# Altium footprint library 1.30-二极管-整流桥堆.PcbLib: 52 footprints (part 3 of 4)
Each footprint in its own frame and in the unit in brackets; x right, y up, seen from the top. Pads: shape width x height; smd on the part's side, far side on the other; paste and mask are expansions set on the pad; w line width, h text height; cw(c..) or ccw(c..) is an arc to the next point about the centre after c.
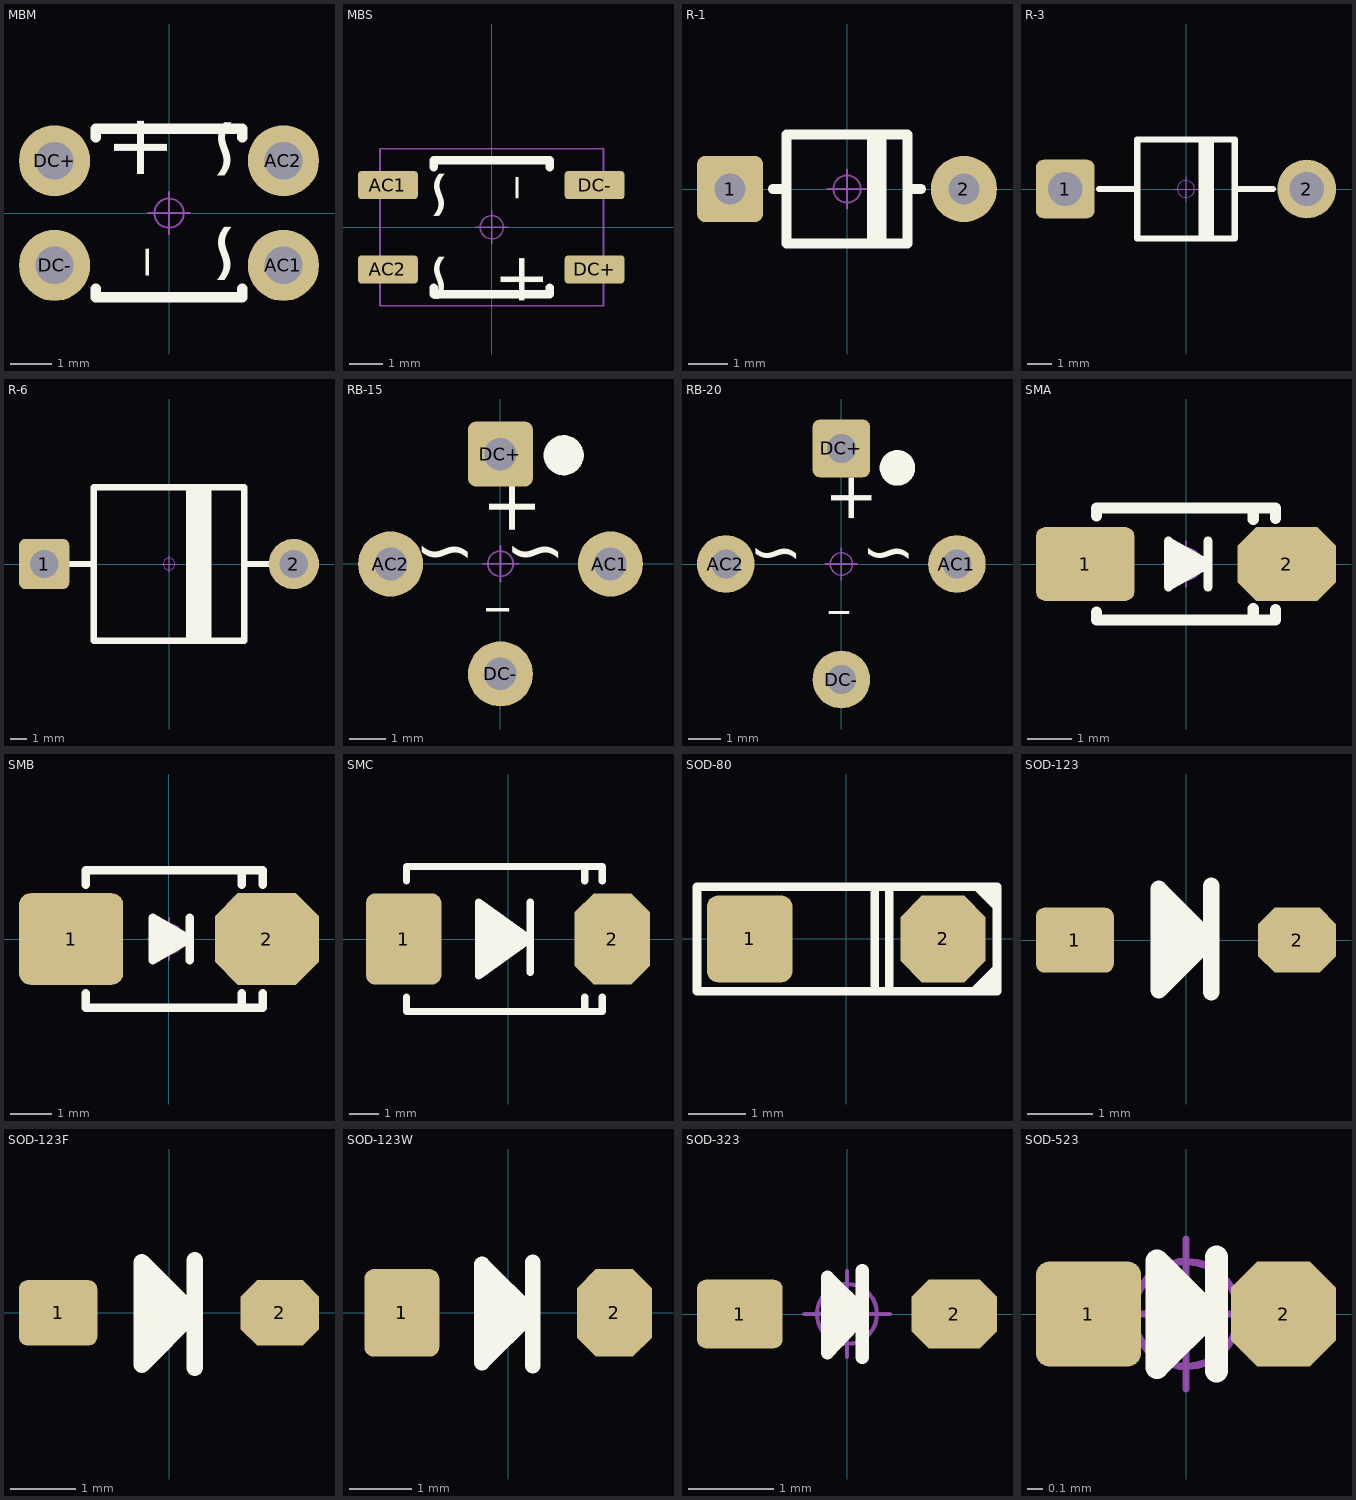
[diagram p2: the footprints below, top view; thin cyan lines are the x and y axes]

## MBM [mm] "4.8*5.2*2.5mm(长宽高)"
pads (4):
  round 1.7 hole 0.9: AC1(2.737,-1.25) AC2(2.737,1.25) DC+(-2.737,1.25) DC-(-2.737,-1.25)
Top Overlay:
  lines w0.254: -1.75,-1.811 -1.75,-2.015 1.75,-2.015 1.75,-1.811 ; -1.75,1.811 -1.75,2.015 1.75,2.015 1.75,1.811
  text "~" at 0.199,-1.817 h2.54
  text "~" at 0.199,0.683 h2.54
  text "-" at -1.707,-1.621 h3.05
  text "+" at -1.8,0.714 h2.54
Mechanical 15:
  circle w0.05: c0,0 r0.35
  lines w0.05: -0.5,0 0.5,0 ; 0,-0.5 0,0.5
3D body "MBM.STEP": height 2.6, standoff -3.11, extent -3.124,-2.4 3.124,2.4

## MBS [mm] "4.1*6.8*2.5mm(长宽高)"
height 12.3
pads (4):
  rrect25% 1.8x0.85 smd: AC1(-3.127,1.27) AC2(-3.127,-1.27) DC+(3.096,-1.27) DC-(3.096,1.27)
Top Overlay:
  lines w0.254: -1.75,-1.811 -1.75,-2.015 1.75,-2.015 1.75,-1.811 ; -1.75,1.811 -1.75,2.015 1.75,2.015 1.75,1.811
  text "+" at 2.05,-0.714 h2.54
  text "-" at 1.957,1.621 h3.05
  text "~" at -0.449,-0.683 h2.54
  text "~" at -0.449,1.817 h2.54
Mechanical 13:
  lines w0.05: -3.363,-2.363 3.363,-2.363 3.363,2.362 -3.363,2.362 -3.363,-2.363
Mechanical 15:
  circle w0.05: c0,0 r0.35
  lines w0.05: -0.5,0 0.5,0 ; 0,-0.5 0,0.5
3D body "MBS.STEP": height 2.6, standoff -0.03, extent -3.4,-2.4 3.4,2.4

## R-1 [mm] "2.5*6mm(直径，脚距）"
pads (2):
  rrect25% 1.7x1.7 hole 0.8: 1(-3,0)
  round 1.7 hole 0.8: 2(3,0)
Top Overlay:
  rectangle: 0.508,-1.397 1.016,1.397
  lines w0.254: -1.905,0 -1.55,0 ; 1.55,0 1.905,0 ; -1.55,-1.397 1.55,-1.397 1.55,1.397 -1.55,1.397 -1.55,-1.397
Mechanical 15:
  circle w0.05: c0,0 r0.35
  lines w0.05: -0.5,0 0.5,0 ; 0,-0.5 0,0.5
3D body "R-1.STEP": height 2.55, standoff -3.45, extent -3.3,-1.251 3.3,1.251

## R-3 [mm] "3.9*9.9mm(直径，脚距）"
pads (2):
  rrect25% 2.4x2.4 hole 1.4: 1(-4.95,0)
  round 2.4 hole 1.4: 2(4.95,0)
Top Overlay:
  rectangle: 0.508,-2.032 1.143,2.032
  lines w0.254: -3.556,0 -2,0 ; 2.032,0 3.556,0 ; -2,-2.032 -2,2.032 2,2.032 2,-2.032 -2,-2.032
Mechanical 15:
  circle w0.05: c0,0 r0.35
  lines w0.05: -0.5,0 0.5,0 ; 0,-0.5 0,0.5
3D body "R-3.STEP": height 3.95, standoff -3.45, extent -5.5,-1.951 5.5,1.951

## R-6 [mm] "8.8*14.9mm(直径，脚距）"
pads (2):
  rrect25% 3x3 hole 1.7: 1(-7.45,0)
  round 3 hole 1.7: 2(7.45,0)
Top Overlay:
  rectangle: 1.016,-4.572 2.54,4.572
  lines w0.381: -6.056,0 -4.5,0 ; 4.5,0 6.024,0 ; -4.5,-4.572 -4.5,4.572 4.5,4.572 4.5,-4.572 -4.5,-4.572
Mechanical 15:
  circle w0.05: c0,0 r0.35
  lines w0.05: -0.5,0 0.5,0 ; 0,-0.5 0,0.5
3D body "R-6.STEP": height 8.8, standoff -3.5, extent -8.1,-4.401 8.1,4.401

## RB-15 [mm] "8.9*3.5mm(直径，高)"
pads (4):
  round 1.8 hole 0.9: AC1(3.041,-0.007) AC2(-3.041,-0.007) DC-(0,-3.048)
  rrect25% 1.8x1.8 hole 0.9: DC+(0,3.033)
Top Overlay:
  circle w0.6: c1.75,3 r0.254
  text "-" at 0.371,-2.457 h3.05
  text "~" at 1.817,-0.801 h2.54
  text "~" at -0.683,-0.801 h2.54
  text "+" at -0.8,0.714 h2.54
Mechanical 15:
  circle w0.05: c0,0 r0.35
  lines w0.05: -0.5,0 0.5,0 ; 0,-0.5 0,0.5
3D body "RB-15.STEP": height 3.63, standoff -3.37, extent -4.45,-4.445 4.45,4.445

## RB-20 [mm] "8.9*3.5mm(直径，高)"
pads (4):
  round 1.8 hole 0.9: AC1(3.606,0) AC2(-3.606,0) DC-(0,-3.606)
  rrect25% 1.8x1.8 hole 0.9: DC+(0,3.606)
Top Overlay:
  circle w0.6: c1.75,3 r0.254
  text "-" at 0.371,-2.707 h3.05
  text "~" at 2.317,-0.801 h2.54
  text "~" at -1.183,-0.801 h2.54
  text "+" at -0.8,1.214 h2.54
Mechanical 15:
  circle w0.05: c0,0 r0.35
  lines w0.05: -0.5,0 0.5,0 ; 0,-0.5 0,0.5
3D body "RB-20.STEP": height 5.48, standoff -3.37, extent -4.625,-4.62 4.625,4.62

## SMA [mm] "4.5x2.6*2.2mm（长宽高，不包括引脚）"
height 2.54
pads (2):
  rrect25% 2.2x1.65 smd: 1(-2.25,0)
  oct 2.2x1.65 smd: 2(2.25,0)
Top Overlay:
  lines w0.203: 0.494,-0.508 0.494,0.508 ; -0.395,-0.508 -0.395,0.508 0.494,0 -0.395,-0.508
  lines w0.254: -2,-1.08 -2,-1.25 2,-1.25 2,-1.016 ; -2,1.08 -2,1.25 2,1.25 2,1.016 ; -0.33,0.305 0.305,0 -0.254,-0.305 -0.254,0.051 0.023,0 ; 1.5,-1.25 1.5,-1 ; 1.5,1 1.5,1.25
Mechanical 15:
  circle w0.05: c0,0 r0.35
  lines w0.05: -0.5,0 0.5,0 ; 0,-0.5 0,0.5
3D body "SMA.stp": height 2.15, standoff 0.05, extent -2.552,-1.3 2.552,1.3

## SMB [mm] "4.7*3.9*2.2mm(长宽高，不包括引脚）"
height 2.4
pads (2):
  rrect25% 2.5x2.2 smd: 1(-2.35,0)
  oct 2.5x2.2 smd: 2(2.35,0)
Top Overlay:
  lines w0.2: -2,-1.298 -2,-1.648 2.25,-1.648 2.25,-1.298 ; -2,1.298 -2,1.648 2.25,1.648 2.25,1.298 ; 1.75,-1.648 1.75,-1.298 ; 1.75,1.298 1.75,1.648
  lines w0.203: 0.5,-0.508 0.5,0.508 ; -0.389,-0.508 -0.389,0.508 0.5,0 -0.389,-0.508
  lines w0.254: -0.254,0 0.279,0 ; 0.279,0 -0.229,0.279 -0.229,-0.305 0.279,0
Mechanical 15:
  circle w0.05: c0,0 r0.35
  lines w0.05: -0.5,0 0.5,0 ; 0,-0.5 0,0.5
3D body "SMB.stp": height 2.35, standoff 0.05, extent -2.65,-1.8 2.65,1.8

## SMC [mm] "7.1x5.9*2.3mm（长宽高，不包括引脚）"
height 2.41
pads (2):
  rrect25% 2.6x3.15 smd: 1(-3.6,0)
  oct 2.6x3.15 smd: 2(3.6,0)
Top Overlay:
  lines w0.254: -3.5,-2 -3.5,-2.5 3.25,-2.5 3.25,-2 ; -3.5,2 -3.5,2.5 3.25,2.5 3.25,2 ; -0.889,0.991 0.5,0 -0.889,-0.965 -0.914,0.762 0.229,0 -0.711,-0.66 -0.762,0.483 0,-0.051 -0.584,-0.33 -0.635,0.152 -0.229,-0.051 -0.737,-0.127 ; 0.762,-1.143 0.762,1.27 ; 2.65,-2.4 2.65,-2 ; 2.65,2 2.65,2.4 ; -1.016,-1.27 -1.016,1.27 0.762,0 -1.016,-1.27
Mechanical 15:
  circle w0.05: c0,0 r0.35
  lines w0.05: -0.5,0 0.5,0 ; 0,-0.5 0,0.5
3D body "SMC.stp": height 2.43, standoff 0.03, extent -3.952,-2.9 3.951,2.9

## SOD-80 [mm]
pads (2):
  rrect25% 1.5x1.524 smd: 1(-1.7,0)
  oct 1.5x1.524 smd: 2(1.7,0)
Top Overlay:
  lines w0.15: -2.627,0.918 -2.627,-0.921 2.648,-0.921 2.648,0.921 -2.627,0.921 ; 0.5,-0.924 0.5,0.897 ; 0.75,-0.924 0.75,0.882 ; 2.242,-0.921 2.648,-0.515 ; 2.289,0.921 2.648,0.56 ; 2.446,0.866 2.596,0.716 ; 2.45,-0.865 2.572,-0.743
3D body "SOD-80.STEP": height 1.5, standoff 0, extent -1.672,-0.75 1.828,0.75

## SOD-123 [mm] "2.7x1.6X1.1mm（长宽高，不包括引脚） 淘宝ID:黄晶宝石"
pads (2):
  rrect25% 1.2x1 smd: 1(-1.714,0)
  oct 1.2x1 smd: 2(1.714,0)
Top Overlay:
  lines w0.254: -0.258,-0.559 -0.233,0.432 0.25,0 -0.004,-0.254 -0.004,0 -0.004,0.254 ; 0.352,0.02 -0.421,0.792 -0.421,-0.775 0.392,0.038 ; 0.392,-0.805 0.392,0.841
Mechanical 15:
  circle w0.05: c0,0 r0.35
  lines w0.05: -0.5,0 0.5,0 ; 0,-0.5 0,0.5
3D body "SOD-123.stp": height 1.2, standoff -0.02, extent -1.85,-0.8 1.85,0.8

## SOD-123F [mm] "2.7x1.6X1.1mm（长宽高，不包括引脚）"
pads (2):
  rrect25% 1.2x1 smd: 1(-1.7,0)
  oct 1.2x1 smd: 2(1.7,0)
Top Overlay:
  lines w0.254: -0.254,0.559 -0.229,-0.432 0.254,0 0,0.254 0,0 0,-0.254 ; 0.356,-0.02 -0.417,-0.792 -0.417,0.775 0.396,-0.038 ; 0.396,-0.841 0.396,0.805
Mechanical 15:
  circle w0.05: c0,0 r0.35
  lines w0.05: -0.5,0 0.5,0 ; 0,-0.5 0,0.5
3D body "SOD-123F.stp": height 1.13, standoff 0.02, extent -1.9,-0.8 1.9,0.8

## SOD-123W [mm]
pads (2):
  rrect25% 1.2x1.4 smd: 1(-1.7,0)
  oct 1.2x1.4 smd: 2(1.7,0)
Top Overlay:
  lines w0.254: -0.254,0.559 -0.229,-0.432 0.254,0 0,0.254 0,0 0,-0.254 ; 0.356,-0.02 -0.417,-0.792 -0.417,0.775 0.396,-0.038 ; 0.396,-0.841 0.396,0.805
Mechanical 15:
  lines w0.003: -0.098,0.537 -0.048,0.588
3D body "User Library-SOD123W.x_b": height 1.13, standoff 0.02, extent -2,-0.95 2,0.95

## SOD-323 [mm] "1.8x1.3X0.9mm（长宽高，不包括引脚）"
pads (2):
  rrect25% 1x0.8 smd: 1(-1.25,0)
  oct 1x0.8 smd: 2(1.25,0)
Top Overlay:
  lines w0.152: 0.178,-0.508 0.178,0.508 ; 0.178,-0.025 -0.229,-0.457 -0.229,0.432 0.178,0.025
  lines w0.254: -0.127,0.254 -0.152,-0.178 0.025,-0.025 -0.025,0.127
Mechanical 15:
  circle w0.05: c0,0 r0.35
  lines w0.05: -0.5,0 0.5,0 ; 0,-0.5 0,0.5
3D body "SOD-323.STEP": height 0.95, standoff 0, extent -1.324,-0.65 1.324,0.65

## SOD-523 [mm] "1.2x0.8X0.6mm（长宽高，不包括引脚）"
pads (2):
  rrect25% 0.7x0.7 smd: 1(-0.65,0)
  oct 0.7x0.7 smd: 2(0.65,0)
Top Overlay:
  rectangle: -0.143,-0.179 0.035,0.176
  lines w0.152: -0.092,-0.001 0.162,-0.001 ; 0.203,-0.381 0.203,0.381 ; 0.162,-0.001 -0.193,0.354 -0.193,-0.357 0.162,-0.001
Mechanical 15:
  circle w0.05: c0,0 r0.35
  lines w0.05: -0.5,0 0.5,0 ; 0,-0.5 0,0.5
3D body "SOD-523.stp": height 0.65, standoff 0.05, extent -0.8,-0.4 0.8,0.4